# Altium footprint library con-samtec.PCBLIB: 805 footprints (part 49 of 55)
Each footprint in its own frame and in the unit in brackets; x right, y up, seen from the top. Pads: shape width x height; smd on the part's side, far side on the other; paste and mask are expansions set on the pad; w line width, h text height; cw(c..) or ccw(c..) is an arc to the next point about the centre after c.
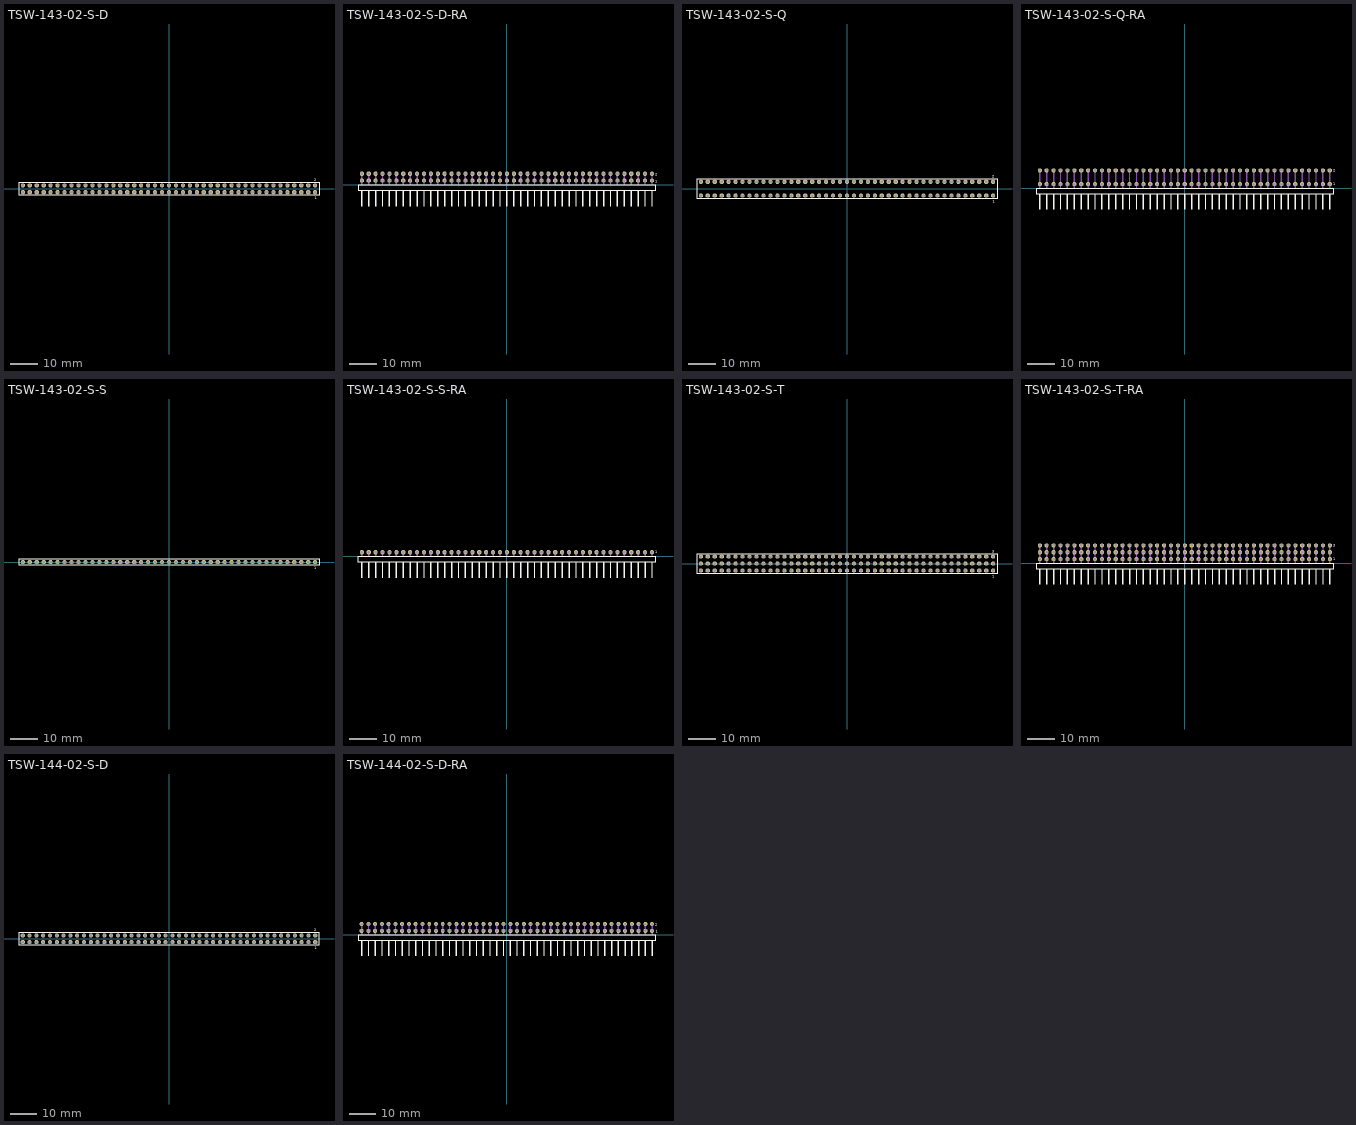
[diagram p48: the footprints below, top view; thin cyan lines are the x and y axes]

## TSW-143-02-S-D [mm]
pads (86):
  oct 1.5x1.5 hole 1: 1(53.34,-1.27) 2(53.34,1.27) 3(50.8,-1.27) 4(50.8,1.27) 5(48.26,-1.27) 6(48.26,1.27) 7(45.72,-1.27) 8(45.72,1.27) 9(43.18,-1.27) 10(43.18,1.27) 11(40.64,-1.27) 12(40.64,1.27) 13(38.1,-1.27) 14(38.1,1.27) 15(35.56,-1.27) 16(35.56,1.27) 17(33.02,-1.27) 18(33.02,1.27) 19(30.48,-1.27) 20(30.48,1.27) 21(27.94,-1.27) 22(27.94,1.27) 23(25.4,-1.27) 24(25.4,1.27) 25(22.86,-1.27) 26(22.86,1.27) 27(20.32,-1.27) 28(20.32,1.27) 29(17.78,-1.27) 30(17.78,1.27) 31(15.24,-1.27) 32(15.24,1.27) 33(12.7,-1.27) 34(12.7,1.27) 35(10.16,-1.27) 36(10.16,1.27) 37(7.62,-1.27) 38(7.62,1.27) 39(5.08,-1.27) 40(5.08,1.27) 41(2.54,-1.27) 42(2.54,1.27) 43(0,-1.27) 44(0,1.27) 45(-2.54,-1.27) 46(-2.54,1.27) 47(-5.08,-1.27) 48(-5.08,1.27) 49(-7.62,-1.27) 50(-7.62,1.27) 51(-10.16,-1.27) 52(-10.16,1.27) 53(-12.7,-1.27) 54(-12.7,1.27) 55(-15.24,-1.27) 56(-15.24,1.27) 57(-17.78,-1.27) 58(-17.78,1.27) 59(-20.32,-1.27) 60(-20.32,1.27) 61(-22.86,-1.27) 62(-22.86,1.27) 63(-25.4,-1.27) 64(-25.4,1.27) 65(-27.94,-1.27) 66(-27.94,1.27) 67(-30.48,-1.27) 68(-30.48,1.27) 69(-33.02,-1.27) 70(-33.02,1.27) 71(-35.56,-1.27) 72(-35.56,1.27) 73(-38.1,-1.27) 74(-38.1,1.27) 75(-40.64,-1.27) 76(-40.64,1.27) 77(-43.18,-1.27) 78(-43.18,1.27) 79(-45.72,-1.27) 80(-45.72,1.27) 81(-48.26,-1.27) 82(-48.26,1.27) 83(-50.8,-1.27) 84(-50.8,1.27) 85(-53.34,-1.27) 86(-53.34,1.27)
Top Overlay:
  lines w0.203: -54.739,-2.425 54.739,-2.425 54.739,2.425 -54.739,2.425 -54.739,-2.425
  text "1" at 53.132,-3.818 h0.94
  text "2" at 52.957,2.744 h0.94
Mechanical 16:
  rectangle: -53.69,-1.62 -52.99,-0.92
  rectangle: -53.69,0.92 -52.99,1.62
  rectangle: -51.15,-1.62 -50.45,-0.92
  rectangle: -51.15,0.92 -50.45,1.62
  rectangle: -48.61,-1.62 -47.91,-0.92
  rectangle: -48.61,0.92 -47.91,1.62
  rectangle: -46.07,-1.62 -45.37,-0.92
  rectangle: -46.07,0.92 -45.37,1.62
  rectangle: -43.53,-1.62 -42.83,-0.92
  rectangle: -43.53,0.92 -42.83,1.62
  rectangle: -40.99,-1.62 -40.29,-0.92
  rectangle: -40.99,0.92 -40.29,1.62
  rectangle: -38.45,-1.62 -37.75,-0.92
  rectangle: -38.45,0.92 -37.75,1.62
  rectangle: -35.91,-1.62 -35.21,-0.92
  rectangle: -35.91,0.92 -35.21,1.62
  rectangle: -33.37,-1.62 -32.67,-0.92
  rectangle: -33.37,0.92 -32.67,1.62
  rectangle: -30.83,-1.62 -30.13,-0.92
  rectangle: -30.83,0.92 -30.13,1.62
  rectangle: -28.29,-1.62 -27.59,-0.92
  rectangle: -28.29,0.92 -27.59,1.62
  rectangle: -25.75,-1.62 -25.05,-0.92
  rectangle: -25.75,0.92 -25.05,1.62
  rectangle: -23.21,-1.62 -22.51,-0.92
  rectangle: -23.21,0.92 -22.51,1.62
  rectangle: -20.67,-1.62 -19.97,-0.92
  rectangle: -20.67,0.92 -19.97,1.62
  rectangle: -18.13,-1.62 -17.43,-0.92
  rectangle: -18.13,0.92 -17.43,1.62
  rectangle: -15.59,-1.62 -14.89,-0.92
  rectangle: -15.59,0.92 -14.89,1.62
  rectangle: -13.05,-1.62 -12.35,-0.92
  rectangle: -13.05,0.92 -12.35,1.62
  rectangle: -10.51,-1.62 -9.81,-0.92
  rectangle: -10.51,0.92 -9.81,1.62
  rectangle: -7.97,-1.62 -7.27,-0.92
  rectangle: -7.97,0.92 -7.27,1.62
  rectangle: -5.43,-1.62 -4.73,-0.92
  rectangle: -5.43,0.92 -4.73,1.62
  rectangle: -2.89,-1.62 -2.19,-0.92
  rectangle: -2.89,0.92 -2.19,1.62
  rectangle: -0.35,-1.62 0.35,-0.92
  rectangle: -0.35,0.92 0.35,1.62
  rectangle: 2.19,-1.62 2.89,-0.92
  rectangle: 2.19,0.92 2.89,1.62
  rectangle: 4.73,-1.62 5.43,-0.92
  rectangle: 4.73,0.92 5.43,1.62
  rectangle: 7.27,-1.62 7.97,-0.92
  rectangle: 7.27,0.92 7.97,1.62
  rectangle: 9.81,-1.62 10.51,-0.92
  rectangle: 9.81,0.92 10.51,1.62
  rectangle: 12.35,-1.62 13.05,-0.92
  rectangle: 12.35,0.92 13.05,1.62
  rectangle: 14.89,-1.62 15.59,-0.92
  rectangle: 14.89,0.92 15.59,1.62
  rectangle: 17.43,-1.62 18.13,-0.92
  rectangle: 17.43,0.92 18.13,1.62
  rectangle: 19.97,-1.62 20.67,-0.92
  rectangle: 19.97,0.92 20.67,1.62
  rectangle: 22.51,-1.62 23.21,-0.92
  rectangle: 22.51,0.92 23.21,1.62
  rectangle: 25.05,-1.62 25.75,-0.92
  rectangle: 25.05,0.92 25.75,1.62
  rectangle: 27.59,-1.62 28.29,-0.92
  rectangle: 27.59,0.92 28.29,1.62
  rectangle: 30.13,-1.62 30.83,-0.92
  rectangle: 30.13,0.92 30.83,1.62
  rectangle: 32.67,-1.62 33.37,-0.92
  rectangle: 32.67,0.92 33.37,1.62
  rectangle: 35.21,-1.62 35.91,-0.92
  rectangle: 35.21,0.92 35.91,1.62
  rectangle: 37.75,-1.62 38.45,-0.92
  rectangle: 37.75,0.92 38.45,1.62
  rectangle: 40.29,-1.62 40.99,-0.92
  rectangle: 40.29,0.92 40.99,1.62
  rectangle: 42.83,-1.62 43.53,-0.92
  rectangle: 42.83,0.92 43.53,1.62
  rectangle: 45.37,-1.62 46.07,-0.92
  rectangle: 45.37,0.92 46.07,1.62
  rectangle: 47.91,-1.62 48.61,-0.92
  rectangle: 47.91,0.92 48.61,1.62
  rectangle: 50.45,-1.62 51.15,-0.92
  rectangle: 50.45,0.92 51.15,1.62
  rectangle: 52.99,-1.62 53.69,-0.92
  rectangle: 52.99,0.92 53.69,1.62

## TSW-143-02-S-D-RA [mil]
pads (86):
  oct 59.06x59.06 hole 39.37: 1(2100,60) 2(2100,160) 3(2000,60) 4(2000,160) 5(1900,60) 6(1900,160) 7(1800,60) 8(1800,160) 9(1700,60) 10(1700,160) 11(1600,60) 12(1600,160) 13(1500,60) 14(1500,160) 15(1400,60) 16(1400,160) 17(1300,60) 18(1300,160) 19(1200,60) 20(1200,160) 21(1100,60) 22(1100,160) 23(1000,60) 24(1000,160) 25(900,60) 26(900,160) 27(800,60) 28(800,160) 29(700,60) 30(700,160) 31(600,60) 32(600,160) 33(500,60) 34(500,160) 35(400,60) 36(400,160) 37(300,60) 38(300,160) 39(200,60) 40(200,160) 41(100,60) 42(100,160) 43(0,60) 44(0,160) 45(-100,60) 46(-100,160) 47(-200,60) 48(-200,160) 49(-300,60) 50(-300,160) 51(-400,60) 52(-400,160) 53(-500,60) 54(-500,160) 55(-600,60) 56(-600,160) 57(-700,60) 58(-700,160) 59(-800,60) 60(-800,160) 61(-900,60) 62(-900,160) 63(-1000,60) 64(-1000,160) 65(-1100,60) 66(-1100,160) 67(-1200,60) 68(-1200,160) 69(-1300,60) 70(-1300,160) 71(-1400,60) 72(-1400,160) 73(-1500,60) 74(-1500,160) 75(-1600,60) 76(-1600,160) 77(-1700,60) 78(-1700,160) 79(-1800,60) 80(-1800,160) 81(-1900,60) 82(-1900,160) 83(-2000,60) 84(-2000,160) 85(-2100,60) 86(-2100,160)
Top Overlay:
  rectangle: -2110,-310.63 -2090,-80.32
  rectangle: -2010,-310.63 -1990,-80.32
  rectangle: -1910,-310.63 -1890,-80.32
  rectangle: -1810,-310.63 -1790,-80.32
  rectangle: -1710,-310.63 -1690,-80.32
  rectangle: -1610,-310.63 -1590,-80.32
  rectangle: -1510,-310.63 -1490,-80.32
  rectangle: -1410,-310.63 -1390,-80.32
  rectangle: -1310,-310.63 -1290,-80.32
  rectangle: -1210,-310.63 -1190,-80.32
  rectangle: -1110,-310.63 -1090,-80.32
  rectangle: -1010,-310.63 -990,-80.32
  rectangle: -910,-310.63 -890,-80.32
  rectangle: -810,-310.63 -790,-80.32
  rectangle: -710,-310.63 -690,-80.32
  rectangle: -610,-310.63 -590,-80.32
  rectangle: -510,-310.63 -490,-80.32
  rectangle: -410,-310.63 -390,-80.32
  rectangle: -310,-310.63 -290,-80.32
  rectangle: -210,-310.63 -190,-80.32
  rectangle: -110,-310.63 -90,-80.32
  rectangle: -10,-310.63 10,-80.32
  rectangle: 90,-310.63 110,-80.32
  rectangle: 190,-310.63 210,-80.32
  rectangle: 290,-310.63 310,-80.32
  rectangle: 390,-310.63 410,-80.32
  rectangle: 490,-310.63 510,-80.32
  rectangle: 590,-310.63 610,-80.32
  rectangle: 690,-310.63 710,-80.32
  rectangle: 790,-310.63 810,-80.32
  rectangle: 890,-310.63 910,-80.32
  rectangle: 990,-310.63 1010,-80.32
  rectangle: 1090,-310.63 1110,-80.32
  rectangle: 1190,-310.63 1210,-80.32
  rectangle: 1290,-310.63 1310,-80.32
  rectangle: 1390,-310.63 1410,-80.32
  rectangle: 1490,-310.63 1510,-80.32
  rectangle: 1590,-310.63 1610,-80.32
  rectangle: 1690,-310.63 1710,-80.32
  rectangle: 1790,-310.63 1810,-80.32
  rectangle: 1890,-310.63 1910,-80.32
  rectangle: 1990,-310.63 2010,-80.32
  rectangle: 2090,-310.63 2110,-80.32
  lines w8: -2155.08,-80.55 2155.08,-80.55 2155.08,-4.17 -2155.08,-4.17 -2155.08,-80.55
  text "1" at 2150.59,30.51 h36.81
  text "2" at 2149.21,129.53 h36.81
Mechanical 16:
  rectangle: -2110,0 -2090,170
  rectangle: -2010,0 -1990,170
  rectangle: -1910,0 -1890,170
  rectangle: -1810,0 -1790,170
  rectangle: -1710,0 -1690,170
  rectangle: -1610,0 -1590,170
  rectangle: -1510,0 -1490,170
  rectangle: -1410,0 -1390,170
  rectangle: -1310,0 -1290,170
  rectangle: -1210,0 -1190,170
  rectangle: -1110,0 -1090,170
  rectangle: -1010,0 -990,170
  rectangle: -910,0 -890,170
  rectangle: -810,0 -790,170
  rectangle: -710,0 -690,170
  rectangle: -610,0 -590,170
  rectangle: -510,0 -490,170
  rectangle: -410,0 -390,170
  rectangle: -310,0 -290,170
  rectangle: -210,0 -190,170
  rectangle: -110,0 -90,170
  rectangle: -10,0 10,170
  rectangle: 90,0 110,170
  rectangle: 190,0 210,170
  rectangle: 290,0 310,170
  rectangle: 390,0 410,170
  rectangle: 490,0 510,170
  rectangle: 590,0 610,170
  rectangle: 690,0 710,170
  rectangle: 790,0 810,170
  rectangle: 890,0 910,170
  rectangle: 990,0 1010,170
  rectangle: 1090,0 1110,170
  rectangle: 1190,0 1210,170
  rectangle: 1290,0 1310,170
  rectangle: 1390,0 1410,170
  rectangle: 1490,0 1510,170
  rectangle: 1590,0 1610,170
  rectangle: 1690,0 1710,170
  rectangle: 1790,0 1810,170
  rectangle: 1890,0 1910,170
  rectangle: 1990,0 2010,170
  rectangle: 2090,0 2110,170

## TSW-143-02-S-Q [mm]
pads (86):
  oct 1.5x1.5 hole 1: 1(53.34,-2.54) 2(53.34,2.54) 3(50.8,-2.54) 4(50.8,2.54) 5(48.26,-2.54) 6(48.26,2.54) 7(45.72,-2.54) 8(45.72,2.54) 9(43.18,-2.54) 10(43.18,2.54) 11(40.64,-2.54) 12(40.64,2.54) 13(38.1,-2.54) 14(38.1,2.54) 15(35.56,-2.54) 16(35.56,2.54) 17(33.02,-2.54) 18(33.02,2.54) 19(30.48,-2.54) 20(30.48,2.54) 21(27.94,-2.54) 22(27.94,2.54) 23(25.4,-2.54) 24(25.4,2.54) 25(22.86,-2.54) 26(22.86,2.54) 27(20.32,-2.54) 28(20.32,2.54) 29(17.78,-2.54) 30(17.78,2.54) 31(15.24,-2.54) 32(15.24,2.54) 33(12.7,-2.54) 34(12.7,2.54) 35(10.16,-2.54) 36(10.16,2.54) 37(7.62,-2.54) 38(7.62,2.54) 39(5.08,-2.54) 40(5.08,2.54) 41(2.54,-2.54) 42(2.54,2.54) 43(0,-2.54) 44(0,2.54) 45(-2.54,-2.54) 46(-2.54,2.54) 47(-5.08,-2.54) 48(-5.08,2.54) 49(-7.62,-2.54) 50(-7.62,2.54) 51(-10.16,-2.54) 52(-10.16,2.54) 53(-12.7,-2.54) 54(-12.7,2.54) 55(-15.24,-2.54) 56(-15.24,2.54) 57(-17.78,-2.54) 58(-17.78,2.54) 59(-20.32,-2.54) 60(-20.32,2.54) 61(-22.86,-2.54) 62(-22.86,2.54) 63(-25.4,-2.54) 64(-25.4,2.54) 65(-27.94,-2.54) 66(-27.94,2.54) 67(-30.48,-2.54) 68(-30.48,2.54) 69(-33.02,-2.54) 70(-33.02,2.54) 71(-35.56,-2.54) 72(-35.56,2.54) 73(-38.1,-2.54) 74(-38.1,2.54) 75(-40.64,-2.54) 76(-40.64,2.54) 77(-43.18,-2.54) 78(-43.18,2.54) 79(-45.72,-2.54) 80(-45.72,2.54) 81(-48.26,-2.54) 82(-48.26,2.54) 83(-50.8,-2.54) 84(-50.8,2.54) 85(-53.34,-2.54) 86(-53.34,2.54)
Top Overlay:
  lines w0.203: -54.739,-3.695 54.739,-3.695 54.739,3.695 -54.739,3.695 -54.739,-3.695
  text "1" at 53.182,-5.138 h0.94
  text "2" at 53.082,3.989 h0.94
Mechanical 16:
  rectangle: -53.69,-2.89 -52.99,-2.19
  rectangle: -53.69,2.19 -52.99,2.89
  rectangle: -51.15,-2.89 -50.45,-2.19
  rectangle: -51.15,2.19 -50.45,2.89
  rectangle: -48.61,-2.89 -47.91,-2.19
  rectangle: -48.61,2.19 -47.91,2.89
  rectangle: -46.07,-2.89 -45.37,-2.19
  rectangle: -46.07,2.19 -45.37,2.89
  rectangle: -43.53,-2.89 -42.83,-2.19
  rectangle: -43.53,2.19 -42.83,2.89
  rectangle: -40.99,-2.89 -40.29,-2.19
  rectangle: -40.99,2.19 -40.29,2.89
  rectangle: -38.45,-2.89 -37.75,-2.19
  rectangle: -38.45,2.19 -37.75,2.89
  rectangle: -35.91,-2.89 -35.21,-2.19
  rectangle: -35.91,2.19 -35.21,2.89
  rectangle: -33.37,-2.89 -32.67,-2.19
  rectangle: -33.37,2.19 -32.67,2.89
  rectangle: -30.83,-2.89 -30.13,-2.19
  rectangle: -30.83,2.19 -30.13,2.89
  rectangle: -28.29,-2.89 -27.59,-2.19
  rectangle: -28.29,2.19 -27.59,2.89
  rectangle: -25.75,-2.89 -25.05,-2.19
  rectangle: -25.75,2.19 -25.05,2.89
  rectangle: -23.21,-2.89 -22.51,-2.19
  rectangle: -23.21,2.19 -22.51,2.89
  rectangle: -20.67,-2.89 -19.97,-2.19
  rectangle: -20.67,2.19 -19.97,2.89
  rectangle: -18.13,-2.89 -17.43,-2.19
  rectangle: -18.13,2.19 -17.43,2.89
  rectangle: -15.59,-2.89 -14.89,-2.19
  rectangle: -15.59,2.19 -14.89,2.89
  rectangle: -13.05,-2.89 -12.35,-2.19
  rectangle: -13.05,2.19 -12.35,2.89
  rectangle: -10.51,-2.89 -9.81,-2.19
  rectangle: -10.51,2.19 -9.81,2.89
  rectangle: -7.97,-2.89 -7.27,-2.19
  rectangle: -7.97,2.19 -7.27,2.89
  rectangle: -5.43,-2.89 -4.73,-2.19
  rectangle: -5.43,2.19 -4.73,2.89
  rectangle: -2.89,-2.89 -2.19,-2.19
  rectangle: -2.89,2.19 -2.19,2.89
  rectangle: -0.35,-2.89 0.35,-2.19
  rectangle: -0.35,2.19 0.35,2.89
  rectangle: 2.19,-2.89 2.89,-2.19
  rectangle: 2.19,2.19 2.89,2.89
  rectangle: 4.73,-2.89 5.43,-2.19
  rectangle: 4.73,2.19 5.43,2.89
  rectangle: 7.27,-2.89 7.97,-2.19
  rectangle: 7.27,2.19 7.97,2.89
  rectangle: 9.81,-2.89 10.51,-2.19
  rectangle: 9.81,2.19 10.51,2.89
  rectangle: 12.35,-2.89 13.05,-2.19
  rectangle: 12.35,2.19 13.05,2.89
  rectangle: 14.89,-2.89 15.59,-2.19
  rectangle: 14.89,2.19 15.59,2.89
  rectangle: 17.43,-2.89 18.13,-2.19
  rectangle: 17.43,2.19 18.13,2.89
  rectangle: 19.97,-2.89 20.67,-2.19
  rectangle: 19.97,2.19 20.67,2.89
  rectangle: 22.51,-2.89 23.21,-2.19
  rectangle: 22.51,2.19 23.21,2.89
  rectangle: 25.05,-2.89 25.75,-2.19
  rectangle: 25.05,2.19 25.75,2.89
  rectangle: 27.59,-2.89 28.29,-2.19
  rectangle: 27.59,2.19 28.29,2.89
  rectangle: 30.13,-2.89 30.83,-2.19
  rectangle: 30.13,2.19 30.83,2.89
  rectangle: 32.67,-2.89 33.37,-2.19
  rectangle: 32.67,2.19 33.37,2.89
  rectangle: 35.21,-2.89 35.91,-2.19
  rectangle: 35.21,2.19 35.91,2.89
  rectangle: 37.75,-2.89 38.45,-2.19
  rectangle: 37.75,2.19 38.45,2.89
  rectangle: 40.29,-2.89 40.99,-2.19
  rectangle: 40.29,2.19 40.99,2.89
  rectangle: 42.83,-2.89 43.53,-2.19
  rectangle: 42.83,2.19 43.53,2.89
  rectangle: 45.37,-2.89 46.07,-2.19
  rectangle: 45.37,2.19 46.07,2.89
  rectangle: 47.91,-2.89 48.61,-2.19
  rectangle: 47.91,2.19 48.61,2.89
  rectangle: 50.45,-2.89 51.15,-2.19
  rectangle: 50.45,2.19 51.15,2.89
  rectangle: 52.99,-2.89 53.69,-2.19
  rectangle: 52.99,2.19 53.69,2.89

## TSW-143-02-S-Q-RA [mil]
pads (86):
  oct 59.06x59.06 hole 39.37: 1(2100,60) 2(2100,260) 3(2000,60) 4(2000,260) 5(1900,60) 6(1900,260) 7(1800,60) 8(1800,260) 9(1700,60) 10(1700,260) 11(1600,60) 12(1600,260) 13(1500,60) 14(1500,260) 15(1400,60) 16(1400,260) 17(1300,60) 18(1300,260) 19(1200,60) 20(1200,260) 21(1100,60) 22(1100,260) 23(1000,60) 24(1000,260) 25(900,60) 26(900,260) 27(800,60) 28(800,260) 29(700,60) 30(700,260) 31(600,60) 32(600,260) 33(500,60) 34(500,260) 35(400,60) 36(400,260) 37(300,60) 38(300,260) 39(200,60) 40(200,260) 41(100,60) 42(100,260) 43(0,60) 44(0,260) 45(-100,60) 46(-100,260) 47(-200,60) 48(-200,260) 49(-300,60) 50(-300,260) 51(-400,60) 52(-400,260) 53(-500,60) 54(-500,260) 55(-600,60) 56(-600,260) 57(-700,60) 58(-700,260) 59(-800,60) 60(-800,260) 61(-900,60) 62(-900,260) 63(-1000,60) 64(-1000,260) 65(-1100,60) 66(-1100,260) 67(-1200,60) 68(-1200,260) 69(-1300,60) 70(-1300,260) 71(-1400,60) 72(-1400,260) 73(-1500,60) 74(-1500,260) 75(-1600,60) 76(-1600,260) 77(-1700,60) 78(-1700,260) 79(-1800,60) 80(-1800,260) 81(-1900,60) 82(-1900,260) 83(-2000,60) 84(-2000,260) 85(-2100,60) 86(-2100,260)
Top Overlay:
  rectangle: -2110,-310.63 -2090,-80.32
  rectangle: -2010,-310.63 -1990,-80.32
  rectangle: -1910,-310.63 -1890,-80.32
  rectangle: -1810,-310.63 -1790,-80.32
  rectangle: -1710,-310.63 -1690,-80.32
  rectangle: -1610,-310.63 -1590,-80.32
  rectangle: -1510,-310.63 -1490,-80.32
  rectangle: -1410,-310.63 -1390,-80.32
  rectangle: -1310,-310.63 -1290,-80.32
  rectangle: -1210,-310.63 -1190,-80.32
  rectangle: -1110,-310.63 -1090,-80.32
  rectangle: -1010,-310.63 -990,-80.32
  rectangle: -910,-310.63 -890,-80.32
  rectangle: -810,-310.63 -790,-80.32
  rectangle: -710,-310.63 -690,-80.32
  rectangle: -610,-310.63 -590,-80.32
  rectangle: -510,-310.63 -490,-80.32
  rectangle: -410,-310.63 -390,-80.32
  rectangle: -310,-310.63 -290,-80.32
  rectangle: -210,-310.63 -190,-80.32
  rectangle: -110,-310.63 -90,-80.32
  rectangle: -10,-310.63 10,-80.32
  rectangle: 90,-310.63 110,-80.32
  rectangle: 190,-310.63 210,-80.32
  rectangle: 290,-310.63 310,-80.32
  rectangle: 390,-310.63 410,-80.32
  rectangle: 490,-310.63 510,-80.32
  rectangle: 590,-310.63 610,-80.32
  rectangle: 690,-310.63 710,-80.32
  rectangle: 790,-310.63 810,-80.32
  rectangle: 890,-310.63 910,-80.32
  rectangle: 990,-310.63 1010,-80.32
  rectangle: 1090,-310.63 1110,-80.32
  rectangle: 1190,-310.63 1210,-80.32
  rectangle: 1290,-310.63 1310,-80.32
  rectangle: 1390,-310.63 1410,-80.32
  rectangle: 1490,-310.63 1510,-80.32
  rectangle: 1590,-310.63 1610,-80.32
  rectangle: 1690,-310.63 1710,-80.32
  rectangle: 1790,-310.63 1810,-80.32
  rectangle: 1890,-310.63 1910,-80.32
  rectangle: 1990,-310.63 2010,-80.32
  rectangle: 2090,-310.63 2110,-80.32
  lines w8: -2155.08,-80.55 2155.08,-80.55 2155.08,-4.17 -2155.08,-4.17 -2155.08,-80.55
  text "1" at 2153.54,43.31 h36.81
  text "2" at 2151.18,242.72 h36.81
Mechanical 16:
  rectangle: -2110,0 -2090,270
  rectangle: -2010,0 -1990,270
  rectangle: -1910,0 -1890,270
  rectangle: -1810,0 -1790,270
  rectangle: -1710,0 -1690,270
  rectangle: -1610,0 -1590,270
  rectangle: -1510,0 -1490,270
  rectangle: -1410,0 -1390,270
  rectangle: -1310,0 -1290,270
  rectangle: -1210,0 -1190,270
  rectangle: -1110,0 -1090,270
  rectangle: -1010,0 -990,270
  rectangle: -910,0 -890,270
  rectangle: -810,0 -790,270
  rectangle: -710,0 -690,270
  rectangle: -610,0 -590,270
  rectangle: -510,0 -490,270
  rectangle: -410,0 -390,270
  rectangle: -310,0 -290,270
  rectangle: -210,0 -190,270
  rectangle: -110,0 -90,270
  rectangle: -10,0 10,270
  rectangle: 90,0 110,270
  rectangle: 190,0 210,270
  rectangle: 290,0 310,270
  rectangle: 390,0 410,270
  rectangle: 490,0 510,270
  rectangle: 590,0 610,270
  rectangle: 690,0 710,270
  rectangle: 790,0 810,270
  rectangle: 890,0 910,270
  rectangle: 990,0 1010,270
  rectangle: 1090,0 1110,270
  rectangle: 1190,0 1210,270
  rectangle: 1290,0 1310,270
  rectangle: 1390,0 1410,270
  rectangle: 1490,0 1510,270
  rectangle: 1590,0 1610,270
  rectangle: 1690,0 1710,270
  rectangle: 1790,0 1810,270
  rectangle: 1890,0 1910,270
  rectangle: 1990,0 2010,270
  rectangle: 2090,0 2110,270

## TSW-143-02-S-S [mm]
pads (43):
  oct 1.5x1.5 hole 1: 1(53.34,0) 2(50.8,0) 3(48.26,0) 4(45.72,0) 5(43.18,0) 6(40.64,0) 7(38.1,0) 8(35.56,0) 9(33.02,0) 10(30.48,0) 11(27.94,0) 12(25.4,0) 13(22.86,0) 14(20.32,0) 15(17.78,0) 16(15.24,0) 17(12.7,0) 18(10.16,0) 19(7.62,0) 20(5.08,0) 21(2.54,0) 22(0,0) 23(-2.54,0) 24(-5.08,0) 25(-7.62,0) 26(-10.16,0) 27(-12.7,0) 28(-15.24,0) 29(-17.78,0) 30(-20.32,0) 31(-22.86,0) 32(-25.4,0) 33(-27.94,0) 34(-30.48,0) 35(-33.02,0) 36(-35.56,0) 37(-38.1,0) 38(-40.64,0) 39(-43.18,0) 40(-45.72,0) 41(-48.26,0) 42(-50.8,0) 43(-53.34,0)
Top Overlay:
  lines w0.203: -54.739,-1.155 54.739,-1.155 54.739,1.155 -54.739,1.155 -54.739,-1.155
  text "1" at 53.082,-2.498 h0.94
Mechanical 16:
  rectangle: -53.69,-0.35 -52.99,0.35
  rectangle: -51.15,-0.35 -50.45,0.35
  rectangle: -48.61,-0.35 -47.91,0.35
  rectangle: -46.07,-0.35 -45.37,0.35
  rectangle: -43.53,-0.35 -42.83,0.35
  rectangle: -40.99,-0.35 -40.29,0.35
  rectangle: -38.45,-0.35 -37.75,0.35
  rectangle: -35.91,-0.35 -35.21,0.35
  rectangle: -33.37,-0.35 -32.67,0.35
  rectangle: -30.83,-0.35 -30.13,0.35
  rectangle: -28.29,-0.35 -27.59,0.35
  rectangle: -25.75,-0.35 -25.05,0.35
  rectangle: -23.21,-0.35 -22.51,0.35
  rectangle: -20.67,-0.35 -19.97,0.35
  rectangle: -18.13,-0.35 -17.43,0.35
  rectangle: -15.59,-0.35 -14.89,0.35
  rectangle: -13.05,-0.35 -12.35,0.35
  rectangle: -10.51,-0.35 -9.81,0.35
  rectangle: -7.97,-0.35 -7.27,0.35
  rectangle: -5.43,-0.35 -4.73,0.35
  rectangle: -2.89,-0.35 -2.19,0.35
  rectangle: -0.35,-0.35 0.35,0.35
  rectangle: 2.19,-0.35 2.89,0.35
  rectangle: 4.73,-0.35 5.43,0.35
  rectangle: 7.27,-0.35 7.97,0.35
  rectangle: 9.81,-0.35 10.51,0.35
  rectangle: 12.35,-0.35 13.05,0.35
  rectangle: 14.89,-0.35 15.59,0.35
  rectangle: 17.43,-0.35 18.13,0.35
  rectangle: 19.97,-0.35 20.67,0.35
  rectangle: 22.51,-0.35 23.21,0.35
  rectangle: 25.05,-0.35 25.75,0.35
  rectangle: 27.59,-0.35 28.29,0.35
  rectangle: 30.13,-0.35 30.83,0.35
  rectangle: 32.67,-0.35 33.37,0.35
  rectangle: 35.21,-0.35 35.91,0.35
  rectangle: 37.75,-0.35 38.45,0.35
  rectangle: 40.29,-0.35 40.99,0.35
  rectangle: 42.83,-0.35 43.53,0.35
  rectangle: 45.37,-0.35 46.07,0.35
  rectangle: 47.91,-0.35 48.61,0.35
  rectangle: 50.45,-0.35 51.15,0.35
  rectangle: 52.99,-0.35 53.69,0.35

## TSW-143-02-S-S-RA [mil]
pads (43):
  oct 59.06x59.06 hole 39.37: 1(2100,60) 2(2000,60) 3(1900,60) 4(1800,60) 5(1700,60) 6(1600,60) 7(1500,60) 8(1400,60) 9(1300,60) 10(1200,60) 11(1100,60) 12(1000,60) 13(900,60) 14(800,60) 15(700,60) 16(600,60) 17(500,60) 18(400,60) 19(300,60) 20(200,60) 21(100,60) 22(0,60) 23(-100,60) 24(-200,60) 25(-300,60) 26(-400,60) 27(-500,60) 28(-600,60) 29(-700,60) 30(-800,60) 31(-900,60) 32(-1000,60) 33(-1100,60) 34(-1200,60) 35(-1300,60) 36(-1400,60) 37(-1500,60) 38(-1600,60) 39(-1700,60) 40(-1800,60) 41(-1900,60) 42(-2000,60) 43(-2100,60)
Top Overlay:
  rectangle: -2110,-310.63 -2090,-80.32
  rectangle: -2010,-310.63 -1990,-80.32
  rectangle: -1910,-310.63 -1890,-80.32
  rectangle: -1810,-310.63 -1790,-80.32
  rectangle: -1710,-310.63 -1690,-80.32
  rectangle: -1610,-310.63 -1590,-80.32
  rectangle: -1510,-310.63 -1490,-80.32
  rectangle: -1410,-310.63 -1390,-80.32
  rectangle: -1310,-310.63 -1290,-80.32
  rectangle: -1210,-310.63 -1190,-80.32
  rectangle: -1110,-310.63 -1090,-80.32
  rectangle: -1010,-310.63 -990,-80.32
  rectangle: -910,-310.63 -890,-80.32
  rectangle: -810,-310.63 -790,-80.32
  rectangle: -710,-310.63 -690,-80.32
  rectangle: -610,-310.63 -590,-80.32
  rectangle: -510,-310.63 -490,-80.32
  rectangle: -410,-310.63 -390,-80.32
  rectangle: -310,-310.63 -290,-80.32
  rectangle: -210,-310.63 -190,-80.32
  rectangle: -110,-310.63 -90,-80.32
  rectangle: -10,-310.63 10,-80.32
  rectangle: 90,-310.63 110,-80.32
  rectangle: 190,-310.63 210,-80.32
  rectangle: 290,-310.63 310,-80.32
  rectangle: 390,-310.63 410,-80.32
  rectangle: 490,-310.63 510,-80.32
  rectangle: 590,-310.63 610,-80.32
  rectangle: 690,-310.63 710,-80.32
  rectangle: 790,-310.63 810,-80.32
  rectangle: 890,-310.63 910,-80.32
  rectangle: 990,-310.63 1010,-80.32
  rectangle: 1090,-310.63 1110,-80.32
  rectangle: 1190,-310.63 1210,-80.32
  rectangle: 1290,-310.63 1310,-80.32
  rectangle: 1390,-310.63 1410,-80.32
  rectangle: 1490,-310.63 1510,-80.32
  rectangle: 1590,-310.63 1610,-80.32
  rectangle: 1690,-310.63 1710,-80.32
  rectangle: 1790,-310.63 1810,-80.32
  rectangle: 1890,-310.63 1910,-80.32
  rectangle: 1990,-310.63 2010,-80.32
  rectangle: 2090,-310.63 2110,-80.32
  lines w8: -2155.08,-80.55 2155.08,-80.55 2155.08,-4.17 -2155.08,-4.17 -2155.08,-80.55
  text "1" at 2150.47,45.35 h36.81
Mechanical 16:
  rectangle: -2110,0 -2090,70
  rectangle: -2010,0 -1990,70
  rectangle: -1910,0 -1890,70
  rectangle: -1810,0 -1790,70
  rectangle: -1710,0 -1690,70
  rectangle: -1610,0 -1590,70
  rectangle: -1510,0 -1490,70
  rectangle: -1410,0 -1390,70
  rectangle: -1310,0 -1290,70
  rectangle: -1210,0 -1190,70
  rectangle: -1110,0 -1090,70
  rectangle: -1010,0 -990,70
  rectangle: -910,0 -890,70
  rectangle: -810,0 -790,70
  rectangle: -710,0 -690,70
  rectangle: -610,0 -590,70
  rectangle: -510,0 -490,70
  rectangle: -410,0 -390,70
  rectangle: -310,0 -290,70
  rectangle: -210,0 -190,70
  rectangle: -110,0 -90,70
  rectangle: -10,0 10,70
  rectangle: 90,0 110,70
  rectangle: 190,0 210,70
  rectangle: 290,0 310,70
  rectangle: 390,0 410,70
  rectangle: 490,0 510,70
  rectangle: 590,0 610,70
  rectangle: 690,0 710,70
  rectangle: 790,0 810,70
  rectangle: 890,0 910,70
  rectangle: 990,0 1010,70
  rectangle: 1090,0 1110,70
  rectangle: 1190,0 1210,70
  rectangle: 1290,0 1310,70
  rectangle: 1390,0 1410,70
  rectangle: 1490,0 1510,70
  rectangle: 1590,0 1610,70
  rectangle: 1690,0 1710,70
  rectangle: 1790,0 1810,70
  rectangle: 1890,0 1910,70
  rectangle: 1990,0 2010,70
  rectangle: 2090,0 2110,70

## TSW-143-02-S-T [mm]
pads (129):
  oct 1.5x1.5 hole 1: 1(53.34,-2.54) 2(53.34,0) 3(53.34,2.54) 4(50.8,-2.54) 5(50.8,0) 6(50.8,2.54) 7(48.26,-2.54) 8(48.26,0) 9(48.26,2.54) 10(45.72,-2.54) 11(45.72,0) 12(45.72,2.54) 13(43.18,-2.54) 14(43.18,0) 15(43.18,2.54) 16(40.64,-2.54) 17(40.64,0) 18(40.64,2.54) 19(38.1,-2.54) 20(38.1,0) 21(38.1,2.54) 22(35.56,-2.54) 23(35.56,0) 24(35.56,2.54) 25(33.02,-2.54) 26(33.02,0) 27(33.02,2.54) 28(30.48,-2.54) 29(30.48,0) 30(30.48,2.54) 31(27.94,-2.54) 32(27.94,0) 33(27.94,2.54) 34(25.4,-2.54) 35(25.4,0) 36(25.4,2.54) 37(22.86,-2.54) 38(22.86,0) 39(22.86,2.54) 40(20.32,-2.54) 41(20.32,0) 42(20.32,2.54) 43(17.78,-2.54) 44(17.78,0) 45(17.78,2.54) 46(15.24,-2.54) 47(15.24,0) 48(15.24,2.54) 49(12.7,-2.54) 50(12.7,0) 51(12.7,2.54) 52(10.16,-2.54) 53(10.16,0) 54(10.16,2.54) 55(7.62,-2.54) 56(7.62,0) 57(7.62,2.54) 58(5.08,-2.54) 59(5.08,0) 60(5.08,2.54) 61(2.54,-2.54) 62(2.54,0) 63(2.54,2.54) 64(0,-2.54) 65(0,0) 66(0,2.54) 67(-2.54,-2.54) 68(-2.54,0) 69(-2.54,2.54) 70(-5.08,-2.54) 71(-5.08,0) 72(-5.08,2.54) 73(-7.62,-2.54) 74(-7.62,0) 75(-7.62,2.54) 76(-10.16,-2.54) 77(-10.16,0) 78(-10.16,2.54) 79(-12.7,-2.54) 80(-12.7,0) 81(-12.7,2.54) 82(-15.24,-2.54) 83(-15.24,0) 84(-15.24,2.54) 85(-17.78,-2.54) 86(-17.78,0) 87(-17.78,2.54) 88(-20.32,-2.54) 89(-20.32,0) 90(-20.32,2.54) 91(-22.86,-2.54) 92(-22.86,0) 93(-22.86,2.54) 94(-25.4,-2.54) 95(-25.4,0) 96(-25.4,2.54) 97(-27.94,-2.54) 98(-27.94,0) 99(-27.94,2.54) 100(-30.48,-2.54) 101(-30.48,0) 102(-30.48,2.54) 103(-33.02,-2.54) 104(-33.02,0) 105(-33.02,2.54) 106(-35.56,-2.54) 107(-35.56,0) 108(-35.56,2.54) 109(-38.1,-2.54) 110(-38.1,0) 111(-38.1,2.54) 112(-40.64,-2.54) 113(-40.64,0) 114(-40.64,2.54) 115(-43.18,-2.54) 116(-43.18,0) 117(-43.18,2.54) 118(-45.72,-2.54) 119(-45.72,0) 120(-45.72,2.54) 121(-48.26,-2.54) 122(-48.26,0) 123(-48.26,2.54) 124(-50.8,-2.54) 125(-50.8,0) 126(-50.8,2.54) 127(-53.34,-2.54) 128(-53.34,0) 129(-53.34,2.54)
Top Overlay:
  lines w0.203: -54.739,-3.695 54.739,-3.695 54.739,3.695 -54.739,3.695 -54.739,-3.695
  text "1" at 53.032,-5.188 h0.94
  text "3" at 53.028,3.989 h0.94
Mechanical 16:
  rectangle: -53.69,-2.89 -52.99,-2.19
  rectangle: -53.69,-0.35 -52.99,0.35
  rectangle: -53.69,2.19 -52.99,2.89
  rectangle: -51.15,-2.89 -50.45,-2.19
  rectangle: -51.15,-0.35 -50.45,0.35
  rectangle: -51.15,2.19 -50.45,2.89
  rectangle: -48.61,-2.89 -47.91,-2.19
  rectangle: -48.61,-0.35 -47.91,0.35
  rectangle: -48.61,2.19 -47.91,2.89
  rectangle: -46.07,-2.89 -45.37,-2.19
  rectangle: -46.07,-0.35 -45.37,0.35
  rectangle: -46.07,2.19 -45.37,2.89
  rectangle: -43.53,-2.89 -42.83,-2.19
  rectangle: -43.53,-0.35 -42.83,0.35
  rectangle: -43.53,2.19 -42.83,2.89
  rectangle: -40.99,-2.89 -40.29,-2.19
  rectangle: -40.99,-0.35 -40.29,0.35
  rectangle: -40.99,2.19 -40.29,2.89
  rectangle: -38.45,-2.89 -37.75,-2.19
  rectangle: -38.45,-0.35 -37.75,0.35
  rectangle: -38.45,2.19 -37.75,2.89
  rectangle: -35.91,-2.89 -35.21,-2.19
  rectangle: -35.91,-0.35 -35.21,0.35
  rectangle: -35.91,2.19 -35.21,2.89
  rectangle: -33.37,-2.89 -32.67,-2.19
  rectangle: -33.37,-0.35 -32.67,0.35
  rectangle: -33.37,2.19 -32.67,2.89
  rectangle: -30.83,-2.89 -30.13,-2.19
  rectangle: -30.83,-0.35 -30.13,0.35
  rectangle: -30.83,2.19 -30.13,2.89
  rectangle: -28.29,-2.89 -27.59,-2.19
  rectangle: -28.29,-0.35 -27.59,0.35
  rectangle: -28.29,2.19 -27.59,2.89
  rectangle: -25.75,-2.89 -25.05,-2.19
  rectangle: -25.75,-0.35 -25.05,0.35
  rectangle: -25.75,2.19 -25.05,2.89
  rectangle: -23.21,-2.89 -22.51,-2.19
  rectangle: -23.21,-0.35 -22.51,0.35
  rectangle: -23.21,2.19 -22.51,2.89
  rectangle: -20.67,-2.89 -19.97,-2.19
  rectangle: -20.67,-0.35 -19.97,0.35
  rectangle: -20.67,2.19 -19.97,2.89
  rectangle: -18.13,-2.89 -17.43,-2.19
  rectangle: -18.13,-0.35 -17.43,0.35
  rectangle: -18.13,2.19 -17.43,2.89
  rectangle: -15.59,-2.89 -14.89,-2.19
  rectangle: -15.59,-0.35 -14.89,0.35
  rectangle: -15.59,2.19 -14.89,2.89
  rectangle: -13.05,-2.89 -12.35,-2.19
  rectangle: -13.05,-0.35 -12.35,0.35
  rectangle: -13.05,2.19 -12.35,2.89
  rectangle: -10.51,-2.89 -9.81,-2.19
  rectangle: -10.51,-0.35 -9.81,0.35
  rectangle: -10.51,2.19 -9.81,2.89
  rectangle: -7.97,-2.89 -7.27,-2.19
  rectangle: -7.97,-0.35 -7.27,0.35
  rectangle: -7.97,2.19 -7.27,2.89
  rectangle: -5.43,-2.89 -4.73,-2.19
  rectangle: -5.43,-0.35 -4.73,0.35
  rectangle: -5.43,2.19 -4.73,2.89
  rectangle: -2.89,-2.89 -2.19,-2.19
  rectangle: -2.89,-0.35 -2.19,0.35
  rectangle: -2.89,2.19 -2.19,2.89
  rectangle: -0.35,-2.89 0.35,-2.19
  rectangle: -0.35,-0.35 0.35,0.35
  rectangle: -0.35,2.19 0.35,2.89
  rectangle: 2.19,-2.89 2.89,-2.19
  rectangle: 2.19,-0.35 2.89,0.35
  rectangle: 2.19,2.19 2.89,2.89
  rectangle: 4.73,-2.89 5.43,-2.19
  rectangle: 4.73,-0.35 5.43,0.35
  rectangle: 4.73,2.19 5.43,2.89
  rectangle: 7.27,-2.89 7.97,-2.19
  rectangle: 7.27,-0.35 7.97,0.35
  rectangle: 7.27,2.19 7.97,2.89
  rectangle: 9.81,-2.89 10.51,-2.19
  rectangle: 9.81,-0.35 10.51,0.35
  rectangle: 9.81,2.19 10.51,2.89
  rectangle: 12.35,-2.89 13.05,-2.19
  rectangle: 12.35,-0.35 13.05,0.35
  rectangle: 12.35,2.19 13.05,2.89
  rectangle: 14.89,-2.89 15.59,-2.19
  rectangle: 14.89,-0.35 15.59,0.35
  rectangle: 14.89,2.19 15.59,2.89
  rectangle: 17.43,-2.89 18.13,-2.19
  rectangle: 17.43,-0.35 18.13,0.35
  rectangle: 17.43,2.19 18.13,2.89
  rectangle: 19.97,-2.89 20.67,-2.19
  rectangle: 19.97,-0.35 20.67,0.35
  rectangle: 19.97,2.19 20.67,2.89
  rectangle: 22.51,-2.89 23.21,-2.19
  rectangle: 22.51,-0.35 23.21,0.35
  rectangle: 22.51,2.19 23.21,2.89
  rectangle: 25.05,-2.89 25.75,-2.19
  rectangle: 25.05,-0.35 25.75,0.35
  rectangle: 25.05,2.19 25.75,2.89
  rectangle: 27.59,-2.89 28.29,-2.19
  rectangle: 27.59,-0.35 28.29,0.35
  rectangle: 27.59,2.19 28.29,2.89
  rectangle: 30.13,-2.89 30.83,-2.19
  rectangle: 30.13,-0.35 30.83,0.35
  rectangle: 30.13,2.19 30.83,2.89
  rectangle: 32.67,-2.89 33.37,-2.19
  rectangle: 32.67,-0.35 33.37,0.35
  rectangle: 32.67,2.19 33.37,2.89
  rectangle: 35.21,-2.89 35.91,-2.19
  rectangle: 35.21,-0.35 35.91,0.35
  rectangle: 35.21,2.19 35.91,2.89
  rectangle: 37.75,-2.89 38.45,-2.19
  rectangle: 37.75,-0.35 38.45,0.35
  rectangle: 37.75,2.19 38.45,2.89
  rectangle: 40.29,-2.89 40.99,-2.19
  rectangle: 40.29,-0.35 40.99,0.35
  rectangle: 40.29,2.19 40.99,2.89
  rectangle: 42.83,-2.89 43.53,-2.19
  rectangle: 42.83,-0.35 43.53,0.35
  rectangle: 42.83,2.19 43.53,2.89
  rectangle: 45.37,-2.89 46.07,-2.19
  rectangle: 45.37,-0.35 46.07,0.35
  rectangle: 45.37,2.19 46.07,2.89
  rectangle: 47.91,-2.89 48.61,-2.19
  rectangle: 47.91,-0.35 48.61,0.35
  rectangle: 47.91,2.19 48.61,2.89
  rectangle: 50.45,-2.89 51.15,-2.19
  rectangle: 50.45,-0.35 51.15,0.35
  rectangle: 50.45,2.19 51.15,2.89
  rectangle: 52.99,-2.89 53.69,-2.19
  rectangle: 52.99,-0.35 53.69,0.35
  rectangle: 52.99,2.19 53.69,2.89

## TSW-143-02-S-T-RA [mil]
pads (129):
  oct 59.06x59.06 hole 39.37: 1(2100,60) 2(2100,160) 3(2100,260) 4(2000,60) 5(2000,160) 6(2000,260) 7(1900,60) 8(1900,160) 9(1900,260) 10(1800,60) 11(1800,160) 12(1800,260) 13(1700,60) 14(1700,160) 15(1700,260) 16(1600,60) 17(1600,160) 18(1600,260) 19(1500,60) 20(1500,160) 21(1500,260) 22(1400,60) 23(1400,160) 24(1400,260) 25(1300,60) 26(1300,160) 27(1300,260) 28(1200,60) 29(1200,160) 30(1200,260) 31(1100,60) 32(1100,160) 33(1100,260) 34(1000,60) 35(1000,160) 36(1000,260) 37(900,60) 38(900,160) 39(900,260) 40(800,60) 41(800,160) 42(800,260) 43(700,60) 44(700,160) 45(700,260) 46(600,60) 47(600,160) 48(600,260) 49(500,60) 50(500,160) 51(500,260) 52(400,60) 53(400,160) 54(400,260) 55(300,60) 56(300,160) 57(300,260) 58(200,60) 59(200,160) 60(200,260) 61(100,60) 62(100,160) 63(100,260) 64(0,60) 65(0,160) 66(0,260) 67(-100,60) 68(-100,160) 69(-100,260) 70(-200,60) 71(-200,160) 72(-200,260) 73(-300,60) 74(-300,160) 75(-300,260) 76(-400,60) 77(-400,160) 78(-400,260) 79(-500,60) 80(-500,160) 81(-500,260) 82(-600,60) 83(-600,160) 84(-600,260) 85(-700,60) 86(-700,160) 87(-700,260) 88(-800,60) 89(-800,160) 90(-800,260) 91(-900,60) 92(-900,160) 93(-900,260) 94(-1000,60) 95(-1000,160) 96(-1000,260) 97(-1100,60) 98(-1100,160) 99(-1100,260) 100(-1200,60) 101(-1200,160) 102(-1200,260) 103(-1300,60) 104(-1300,160) 105(-1300,260) 106(-1400,60) 107(-1400,160) 108(-1400,260) 109(-1500,60) 110(-1500,160) 111(-1500,260) 112(-1600,60) 113(-1600,160) 114(-1600,260) 115(-1700,60) 116(-1700,160) 117(-1700,260) 118(-1800,60) 119(-1800,160) 120(-1800,260) 121(-1900,60) 122(-1900,160) 123(-1900,260) 124(-2000,60) 125(-2000,160) 126(-2000,260) 127(-2100,60) 128(-2100,160) 129(-2100,260)
Top Overlay:
  rectangle: -2110,-310.63 -2090,-80.32
  rectangle: -2010,-310.63 -1990,-80.32
  rectangle: -1910,-310.63 -1890,-80.32
  rectangle: -1810,-310.63 -1790,-80.32
  rectangle: -1710,-310.63 -1690,-80.32
  rectangle: -1610,-310.63 -1590,-80.32
  rectangle: -1510,-310.63 -1490,-80.32
  rectangle: -1410,-310.63 -1390,-80.32
  rectangle: -1310,-310.63 -1290,-80.32
  rectangle: -1210,-310.63 -1190,-80.32
  rectangle: -1110,-310.63 -1090,-80.32
  rectangle: -1010,-310.63 -990,-80.32
  rectangle: -910,-310.63 -890,-80.32
  rectangle: -810,-310.63 -790,-80.32
  rectangle: -710,-310.63 -690,-80.32
  rectangle: -610,-310.63 -590,-80.32
  rectangle: -510,-310.63 -490,-80.32
  rectangle: -410,-310.63 -390,-80.32
  rectangle: -310,-310.63 -290,-80.32
  rectangle: -210,-310.63 -190,-80.32
  rectangle: -110,-310.63 -90,-80.32
  rectangle: -10,-310.63 10,-80.32
  rectangle: 90,-310.63 110,-80.32
  rectangle: 190,-310.63 210,-80.32
  rectangle: 290,-310.63 310,-80.32
  rectangle: 390,-310.63 410,-80.32
  rectangle: 490,-310.63 510,-80.32
  rectangle: 590,-310.63 610,-80.32
  rectangle: 690,-310.63 710,-80.32
  rectangle: 790,-310.63 810,-80.32
  rectangle: 890,-310.63 910,-80.32
  rectangle: 990,-310.63 1010,-80.32
  rectangle: 1090,-310.63 1110,-80.32
  rectangle: 1190,-310.63 1210,-80.32
  rectangle: 1290,-310.63 1310,-80.32
  rectangle: 1390,-310.63 1410,-80.32
  rectangle: 1490,-310.63 1510,-80.32
  rectangle: 1590,-310.63 1610,-80.32
  rectangle: 1690,-310.63 1710,-80.32
  rectangle: 1790,-310.63 1810,-80.32
  rectangle: 1890,-310.63 1910,-80.32
  rectangle: 1990,-310.63 2010,-80.32
  rectangle: 2090,-310.63 2110,-80.32
  lines w8: -2155.08,-80.55 2155.08,-80.55 2155.08,-4.17 -2155.08,-4.17 -2155.08,-80.55
  text "1" at 2151.57,41.34 h36.81
  text "3" at 2152.17,236.81 h36.81
Mechanical 16:
  rectangle: -2110,0 -2090,270
  rectangle: -2010,0 -1990,270
  rectangle: -1910,0 -1890,270
  rectangle: -1810,0 -1790,270
  rectangle: -1710,0 -1690,270
  rectangle: -1610,0 -1590,270
  rectangle: -1510,0 -1490,270
  rectangle: -1410,0 -1390,270
  rectangle: -1310,0 -1290,270
  rectangle: -1210,0 -1190,270
  rectangle: -1110,0 -1090,270
  rectangle: -1010,0 -990,270
  rectangle: -910,0 -890,270
  rectangle: -810,0 -790,270
  rectangle: -710,0 -690,270
  rectangle: -610,0 -590,270
  rectangle: -510,0 -490,270
  rectangle: -410,0 -390,270
  rectangle: -310,0 -290,270
  rectangle: -210,0 -190,270
  rectangle: -110,0 -90,270
  rectangle: -10,0 10,270
  rectangle: 90,0 110,270
  rectangle: 190,0 210,270
  rectangle: 290,0 310,270
  rectangle: 390,0 410,270
  rectangle: 490,0 510,270
  rectangle: 590,0 610,270
  rectangle: 690,0 710,270
  rectangle: 790,0 810,270
  rectangle: 890,0 910,270
  rectangle: 990,0 1010,270
  rectangle: 1090,0 1110,270
  rectangle: 1190,0 1210,270
  rectangle: 1290,0 1310,270
  rectangle: 1390,0 1410,270
  rectangle: 1490,0 1510,270
  rectangle: 1590,0 1610,270
  rectangle: 1690,0 1710,270
  rectangle: 1790,0 1810,270
  rectangle: 1890,0 1910,270
  rectangle: 1990,0 2010,270
  rectangle: 2090,0 2110,270

## TSW-144-02-S-D [mm]
pads (88):
  oct 1.5x1.5 hole 1: 1(54.61,-1.27) 2(54.61,1.27) 3(52.07,-1.27) 4(52.07,1.27) 5(49.53,-1.27) 6(49.53,1.27) 7(46.99,-1.27) 8(46.99,1.27) 9(44.45,-1.27) 10(44.45,1.27) 11(41.91,-1.27) 12(41.91,1.27) 13(39.37,-1.27) 14(39.37,1.27) 15(36.83,-1.27) 16(36.83,1.27) 17(34.29,-1.27) 18(34.29,1.27) 19(31.75,-1.27) 20(31.75,1.27) 21(29.21,-1.27) 22(29.21,1.27) 23(26.67,-1.27) 24(26.67,1.27) 25(24.13,-1.27) 26(24.13,1.27) 27(21.59,-1.27) 28(21.59,1.27) 29(19.05,-1.27) 30(19.05,1.27) 31(16.51,-1.27) 32(16.51,1.27) 33(13.97,-1.27) 34(13.97,1.27) 35(11.43,-1.27) 36(11.43,1.27) 37(8.89,-1.27) 38(8.89,1.27) 39(6.35,-1.27) 40(6.35,1.27) 41(3.81,-1.27) 42(3.81,1.27) 43(1.27,-1.27) 44(1.27,1.27) 45(-1.27,-1.27) 46(-1.27,1.27) 47(-3.81,-1.27) 48(-3.81,1.27) 49(-6.35,-1.27) 50(-6.35,1.27) 51(-8.89,-1.27) 52(-8.89,1.27) 53(-11.43,-1.27) 54(-11.43,1.27) 55(-13.97,-1.27) 56(-13.97,1.27) 57(-16.51,-1.27) 58(-16.51,1.27) 59(-19.05,-1.27) 60(-19.05,1.27) 61(-21.59,-1.27) 62(-21.59,1.27) 63(-24.13,-1.27) 64(-24.13,1.27) 65(-26.67,-1.27) 66(-26.67,1.27) 67(-29.21,-1.27) 68(-29.21,1.27) 69(-31.75,-1.27) 70(-31.75,1.27) 71(-34.29,-1.27) 72(-34.29,1.27) 73(-36.83,-1.27) 74(-36.83,1.27) 75(-39.37,-1.27) 76(-39.37,1.27) 77(-41.91,-1.27) 78(-41.91,1.27) 79(-44.45,-1.27) 80(-44.45,1.27) 81(-46.99,-1.27) 82(-46.99,1.27) 83(-49.53,-1.27) 84(-49.53,1.27) 85(-52.07,-1.27) 86(-52.07,1.27) 87(-54.61,-1.27) 88(-54.61,1.27)
Top Overlay:
  lines w0.203: -56.009,-2.425 56.009,-2.425 56.009,2.425 -56.009,2.425 -56.009,-2.425
  text "1" at 54.402,-3.818 h0.94
  text "2" at 54.227,2.744 h0.94
Mechanical 16:
  rectangle: -54.96,-1.62 -54.26,-0.92
  rectangle: -54.96,0.92 -54.26,1.62
  rectangle: -52.42,-1.62 -51.72,-0.92
  rectangle: -52.42,0.92 -51.72,1.62
  rectangle: -49.88,-1.62 -49.18,-0.92
  rectangle: -49.88,0.92 -49.18,1.62
  rectangle: -47.34,-1.62 -46.64,-0.92
  rectangle: -47.34,0.92 -46.64,1.62
  rectangle: -44.8,-1.62 -44.1,-0.92
  rectangle: -44.8,0.92 -44.1,1.62
  rectangle: -42.26,-1.62 -41.56,-0.92
  rectangle: -42.26,0.92 -41.56,1.62
  rectangle: -39.72,-1.62 -39.02,-0.92
  rectangle: -39.72,0.92 -39.02,1.62
  rectangle: -37.18,-1.62 -36.48,-0.92
  rectangle: -37.18,0.92 -36.48,1.62
  rectangle: -34.64,-1.62 -33.94,-0.92
  rectangle: -34.64,0.92 -33.94,1.62
  rectangle: -32.1,-1.62 -31.4,-0.92
  rectangle: -32.1,0.92 -31.4,1.62
  rectangle: -29.56,-1.62 -28.86,-0.92
  rectangle: -29.56,0.92 -28.86,1.62
  rectangle: -27.02,-1.62 -26.32,-0.92
  rectangle: -27.02,0.92 -26.32,1.62
  rectangle: -24.48,-1.62 -23.78,-0.92
  rectangle: -24.48,0.92 -23.78,1.62
  rectangle: -21.94,-1.62 -21.24,-0.92
  rectangle: -21.94,0.92 -21.24,1.62
  rectangle: -19.4,-1.62 -18.7,-0.92
  rectangle: -19.4,0.92 -18.7,1.62
  rectangle: -16.86,-1.62 -16.16,-0.92
  rectangle: -16.86,0.92 -16.16,1.62
  rectangle: -14.32,-1.62 -13.62,-0.92
  rectangle: -14.32,0.92 -13.62,1.62
  rectangle: -11.78,-1.62 -11.08,-0.92
  rectangle: -11.78,0.92 -11.08,1.62
  rectangle: -9.24,-1.62 -8.54,-0.92
  rectangle: -9.24,0.92 -8.54,1.62
  rectangle: -6.7,-1.62 -6,-0.92
  rectangle: -6.7,0.92 -6,1.62
  rectangle: -4.16,-1.62 -3.46,-0.92
  rectangle: -4.16,0.92 -3.46,1.62
  rectangle: -1.62,-1.62 -0.92,-0.92
  rectangle: -1.62,0.92 -0.92,1.62
  rectangle: 0.92,-1.62 1.62,-0.92
  rectangle: 0.92,0.92 1.62,1.62
  rectangle: 3.46,-1.62 4.16,-0.92
  rectangle: 3.46,0.92 4.16,1.62
  rectangle: 6,-1.62 6.7,-0.92
  rectangle: 6,0.92 6.7,1.62
  rectangle: 8.54,-1.62 9.24,-0.92
  rectangle: 8.54,0.92 9.24,1.62
  rectangle: 11.08,-1.62 11.78,-0.92
  rectangle: 11.08,0.92 11.78,1.62
  rectangle: 13.62,-1.62 14.32,-0.92
  rectangle: 13.62,0.92 14.32,1.62
  rectangle: 16.16,-1.62 16.86,-0.92
  rectangle: 16.16,0.92 16.86,1.62
  rectangle: 18.7,-1.62 19.4,-0.92
  rectangle: 18.7,0.92 19.4,1.62
  rectangle: 21.24,-1.62 21.94,-0.92
  rectangle: 21.24,0.92 21.94,1.62
  rectangle: 23.78,-1.62 24.48,-0.92
  rectangle: 23.78,0.92 24.48,1.62
  rectangle: 26.32,-1.62 27.02,-0.92
  rectangle: 26.32,0.92 27.02,1.62
  rectangle: 28.86,-1.62 29.56,-0.92
  rectangle: 28.86,0.92 29.56,1.62
  rectangle: 31.4,-1.62 32.1,-0.92
  rectangle: 31.4,0.92 32.1,1.62
  rectangle: 33.94,-1.62 34.64,-0.92
  rectangle: 33.94,0.92 34.64,1.62
  rectangle: 36.48,-1.62 37.18,-0.92
  rectangle: 36.48,0.92 37.18,1.62
  rectangle: 39.02,-1.62 39.72,-0.92
  rectangle: 39.02,0.92 39.72,1.62
  rectangle: 41.56,-1.62 42.26,-0.92
  rectangle: 41.56,0.92 42.26,1.62
  rectangle: 44.1,-1.62 44.8,-0.92
  rectangle: 44.1,0.92 44.8,1.62
  rectangle: 46.64,-1.62 47.34,-0.92
  rectangle: 46.64,0.92 47.34,1.62
  rectangle: 49.18,-1.62 49.88,-0.92
  rectangle: 49.18,0.92 49.88,1.62
  rectangle: 51.72,-1.62 52.42,-0.92
  rectangle: 51.72,0.92 52.42,1.62
  rectangle: 54.26,-1.62 54.96,-0.92
  rectangle: 54.26,0.92 54.96,1.62

## TSW-144-02-S-D-RA [mil]
pads (88):
  oct 59.06x59.06 hole 39.37: 1(2150,60) 2(2150,160) 3(2050,60) 4(2050,160) 5(1950,60) 6(1950,160) 7(1850,60) 8(1850,160) 9(1750,60) 10(1750,160) 11(1650,60) 12(1650,160) 13(1550,60) 14(1550,160) 15(1450,60) 16(1450,160) 17(1350,60) 18(1350,160) 19(1250,60) 20(1250,160) 21(1150,60) 22(1150,160) 23(1050,60) 24(1050,160) 25(950,60) 26(950,160) 27(850,60) 28(850,160) 29(750,60) 30(750,160) 31(650,60) 32(650,160) 33(550,60) 34(550,160) 35(450,60) 36(450,160) 37(350,60) 38(350,160) 39(250,60) 40(250,160) 41(150,60) 42(150,160) 43(50,60) 44(50,160) 45(-50,60) 46(-50,160) 47(-150,60) 48(-150,160) 49(-250,60) 50(-250,160) 51(-350,60) 52(-350,160) 53(-450,60) 54(-450,160) 55(-550,60) 56(-550,160) 57(-650,60) 58(-650,160) 59(-750,60) 60(-750,160) 61(-850,60) 62(-850,160) 63(-950,60) 64(-950,160) 65(-1050,60) 66(-1050,160) 67(-1150,60) 68(-1150,160) 69(-1250,60) 70(-1250,160) 71(-1350,60) 72(-1350,160) 73(-1450,60) 74(-1450,160) 75(-1550,60) 76(-1550,160) 77(-1650,60) 78(-1650,160) 79(-1750,60) 80(-1750,160) 81(-1850,60) 82(-1850,160) 83(-1950,60) 84(-1950,160) 85(-2050,60) 86(-2050,160) 87(-2150,60) 88(-2150,160)
Top Overlay:
  rectangle: -2160,-310.63 -2140,-80.32
  rectangle: -2060,-310.63 -2040,-80.32
  rectangle: -1960,-310.63 -1940,-80.32
  rectangle: -1860,-310.63 -1840,-80.32
  rectangle: -1760,-310.63 -1740,-80.32
  rectangle: -1660,-310.63 -1640,-80.32
  rectangle: -1560,-310.63 -1540,-80.32
  rectangle: -1460,-310.63 -1440,-80.32
  rectangle: -1360,-310.63 -1340,-80.32
  rectangle: -1260,-310.63 -1240,-80.32
  rectangle: -1160,-310.63 -1140,-80.32
  rectangle: -1060,-310.63 -1040,-80.32
  rectangle: -960,-310.63 -940,-80.32
  rectangle: -860,-310.63 -840,-80.32
  rectangle: -760,-310.63 -740,-80.32
  rectangle: -660,-310.63 -640,-80.32
  rectangle: -560,-310.63 -540,-80.32
  rectangle: -460,-310.63 -440,-80.32
  rectangle: -360,-310.63 -340,-80.32
  rectangle: -260,-310.63 -240,-80.32
  rectangle: -160,-310.63 -140,-80.32
  rectangle: -60,-310.63 -40,-80.32
  rectangle: 40,-310.63 60,-80.32
  rectangle: 140,-310.63 160,-80.32
  rectangle: 240,-310.63 260,-80.32
  rectangle: 340,-310.63 360,-80.32
  rectangle: 440,-310.63 460,-80.32
  rectangle: 540,-310.63 560,-80.32
  rectangle: 640,-310.63 660,-80.32
  rectangle: 740,-310.63 760,-80.32
  rectangle: 840,-310.63 860,-80.32
  rectangle: 940,-310.63 960,-80.32
  rectangle: 1040,-310.63 1060,-80.32
  rectangle: 1140,-310.63 1160,-80.32
  rectangle: 1240,-310.63 1260,-80.32
  rectangle: 1340,-310.63 1360,-80.32
  rectangle: 1440,-310.63 1460,-80.32
  rectangle: 1540,-310.63 1560,-80.32
  rectangle: 1640,-310.63 1660,-80.32
  rectangle: 1740,-310.63 1760,-80.32
  rectangle: 1840,-310.63 1860,-80.32
  rectangle: 1940,-310.63 1960,-80.32
  rectangle: 2040,-310.63 2060,-80.32
  rectangle: 2140,-310.63 2160,-80.32
  lines w8: -2205.08,-80.55 2205.08,-80.55 2205.08,-4.17 -2205.08,-4.17 -2205.08,-80.55
  text "1" at 2200.59,30.51 h36.81
  text "2" at 2199.21,129.53 h36.81
Mechanical 16:
  rectangle: -2160,0 -2140,170
  rectangle: -2060,0 -2040,170
  rectangle: -1960,0 -1940,170
  rectangle: -1860,0 -1840,170
  rectangle: -1760,0 -1740,170
  rectangle: -1660,0 -1640,170
  rectangle: -1560,0 -1540,170
  rectangle: -1460,0 -1440,170
  rectangle: -1360,0 -1340,170
  rectangle: -1260,0 -1240,170
  rectangle: -1160,0 -1140,170
  rectangle: -1060,0 -1040,170
  rectangle: -960,0 -940,170
  rectangle: -860,0 -840,170
  rectangle: -760,0 -740,170
  rectangle: -660,0 -640,170
  rectangle: -560,0 -540,170
  rectangle: -460,0 -440,170
  rectangle: -360,0 -340,170
  rectangle: -260,0 -240,170
  rectangle: -160,0 -140,170
  rectangle: -60,0 -40,170
  rectangle: 40,0 60,170
  rectangle: 140,0 160,170
  rectangle: 240,0 260,170
  rectangle: 340,0 360,170
  rectangle: 440,0 460,170
  rectangle: 540,0 560,170
  rectangle: 640,0 660,170
  rectangle: 740,0 760,170
  rectangle: 840,0 860,170
  rectangle: 940,0 960,170
  rectangle: 1040,0 1060,170
  rectangle: 1140,0 1160,170
  rectangle: 1240,0 1260,170
  rectangle: 1340,0 1360,170
  rectangle: 1440,0 1460,170
  rectangle: 1540,0 1560,170
  rectangle: 1640,0 1660,170
  rectangle: 1740,0 1760,170
  rectangle: 1840,0 1860,170
  rectangle: 1940,0 1960,170
  rectangle: 2040,0 2060,170
  rectangle: 2140,0 2160,170